# Altium footprint library altera-stratix-iv.PCBLIB: 5 footprints (part 1 of 4)
Each footprint in its own frame and in the unit in brackets; x right, y up, seen from the top. Pads: shape width x height; smd on the part's side, far side on the other; paste and mask are expansions set on the pad; w line width, h text height; cw(c..) or ccw(c..) is an arc to the next point about the centre after c.
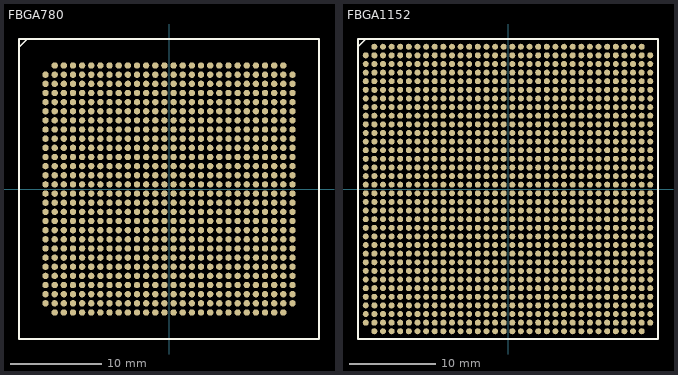
[diagram p0: the footprints below, top view; thin cyan lines are the x and y axes]

## FBGA780 [mil]
pads (780):
  rrect100% 27.56x27.56 smd: A2(-492.13,531.5) A3(-452.76,531.5) A4(-413.39,531.5) A5(-374.02,531.5) A6(-334.65,531.5) A7(-295.28,531.5) A8(-255.91,531.5) A9(-216.54,531.5) A10(-177.17,531.5) A11(-137.8,531.5) A12(-98.43,531.5) A13(-59.06,531.5) A14(-19.69,531.5) A15(19.69,531.5) A16(59.06,531.5) A17(98.43,531.5) A18(137.8,531.5) A19(177.17,531.5) A20(216.54,531.5) A21(255.91,531.5) A22(295.28,531.5) A23(334.65,531.5) A24(374.02,531.5) A25(413.39,531.5) A26(452.76,531.5) A27(492.13,531.5) AA1(-531.5,-255.91) AA2(-492.13,-255.91) AA3(-452.76,-255.91) AA4(-413.39,-255.91) AA5(-374.02,-255.91) AA6(-334.65,-255.91) AA7(-295.28,-255.91) AA8(-255.91,-255.91) AA9(-216.54,-255.91) AA10(-177.17,-255.91) AA11(-137.8,-255.91) AA12(-98.43,-255.91) AA13(-59.06,-255.91) AA14(-19.69,-255.91) AA15(19.69,-255.91) AA16(59.06,-255.91) AA17(98.43,-255.91) AA18(137.8,-255.91) AA19(177.17,-255.91) AA20(216.54,-255.91) AA21(255.91,-255.91) AA22(295.28,-255.91) AA23(334.65,-255.91) AA24(374.02,-255.91) AA25(413.39,-255.91) AA26(452.76,-255.91) AA27(492.13,-255.91) AA28(531.5,-255.91) AB1(-531.5,-295.28) AB2(-492.13,-295.28) AB3(-452.76,-295.28) AB4(-413.39,-295.28) AB5(-374.02,-295.28) AB6(-334.65,-295.28) AB7(-295.28,-295.28) AB8(-255.91,-295.28) AB9(-216.54,-295.28) AB10(-177.17,-295.28) AB11(-137.8,-295.28) AB12(-98.43,-295.28) AB13(-59.06,-295.28) AB14(-19.69,-295.28) AB15(19.69,-295.28) AB16(59.06,-295.28) AB17(98.43,-295.28) AB18(137.8,-295.28) AB19(177.17,-295.28) AB20(216.54,-295.28) AB21(255.91,-295.28) AB22(295.28,-295.28) AB23(334.65,-295.28) AB24(374.02,-295.28) AB25(413.39,-295.28) AB26(452.76,-295.28) AB27(492.13,-295.28) AB28(531.5,-295.28) AC1(-531.5,-334.65) AC2(-492.13,-334.65) AC3(-452.76,-334.65) AC4(-413.39,-334.65) AC5(-374.02,-334.65) AC6(-334.65,-334.65) AC7(-295.28,-334.65) AC8(-255.91,-334.65) AC9(-216.54,-334.65) AC10(-177.17,-334.65) AC11(-137.8,-334.65) AC12(-98.43,-334.65) AC13(-59.06,-334.65) AC14(-19.69,-334.65) AC15(19.69,-334.65) AC16(59.06,-334.65) AC17(98.43,-334.65) AC18(137.8,-334.65) AC19(177.17,-334.65) AC20(216.54,-334.65) AC21(255.91,-334.65) AC22(295.28,-334.65) AC23(334.65,-334.65) AC24(374.02,-334.65) AC25(413.39,-334.65) AC26(452.76,-334.65) AC27(492.13,-334.65) AC28(531.5,-334.65) AD1(-531.5,-374.02) AD2(-492.13,-374.02) AD3(-452.76,-374.02) AD4(-413.39,-374.02) AD5(-374.02,-374.02) AD6(-334.65,-374.02) AD7(-295.28,-374.02) AD8(-255.91,-374.02) AD9(-216.54,-374.02) AD10(-177.17,-374.02) AD11(-137.8,-374.02) AD12(-98.43,-374.02) AD13(-59.06,-374.02) AD14(-19.69,-374.02) AD15(19.69,-374.02) AD16(59.06,-374.02) AD17(98.43,-374.02) AD18(137.8,-374.02) AD19(177.17,-374.02) AD20(216.54,-374.02) AD21(255.91,-374.02) AD22(295.28,-374.02) AD23(334.65,-374.02) AD24(374.02,-374.02) AD25(413.39,-374.02) AD26(452.76,-374.02) AD27(492.13,-374.02) AD28(531.5,-374.02) AE1(-531.5,-413.39) AE2(-492.13,-413.39) AE3(-452.76,-413.39) AE4(-413.39,-413.39) AE5(-374.02,-413.39) AE6(-334.65,-413.39) AE7(-295.28,-413.39) AE8(-255.91,-413.39) AE9(-216.54,-413.39) AE10(-177.17,-413.39) AE11(-137.8,-413.39) AE12(-98.43,-413.39) AE13(-59.06,-413.39) AE14(-19.69,-413.39) AE15(19.69,-413.39) AE16(59.06,-413.39) AE17(98.43,-413.39) AE18(137.8,-413.39) AE19(177.17,-413.39) AE20(216.54,-413.39) AE21(255.91,-413.39) AE22(295.28,-413.39) AE23(334.65,-413.39) AE24(374.02,-413.39) AE25(413.39,-413.39) AE26(452.76,-413.39) AE27(492.13,-413.39) AE28(531.5,-413.39) AF1(-531.5,-452.76) AF2(-492.13,-452.76) AF3(-452.76,-452.76) AF4(-413.39,-452.76) AF5(-374.02,-452.76) AF6(-334.65,-452.76) AF7(-295.28,-452.76) AF8(-255.91,-452.76) AF9(-216.54,-452.76) AF10(-177.17,-452.76) AF11(-137.8,-452.76) AF12(-98.43,-452.76) AF13(-59.06,-452.76) AF14(-19.69,-452.76) AF15(19.69,-452.76) AF16(59.06,-452.76) AF17(98.43,-452.76) AF18(137.8,-452.76) AF19(177.17,-452.76) AF20(216.54,-452.76) AF21(255.91,-452.76) AF22(295.28,-452.76) AF23(334.65,-452.76) AF24(374.02,-452.76) AF25(413.39,-452.76) AF26(452.76,-452.76) AF27(492.13,-452.76) AF28(531.5,-452.76) AG1(-531.5,-492.13) AG2(-492.13,-492.13) AG3(-452.76,-492.13) AG4(-413.39,-492.13) AG5(-374.02,-492.13) AG6(-334.65,-492.13) AG7(-295.28,-492.13) AG8(-255.91,-492.13) AG9(-216.54,-492.13) AG10(-177.17,-492.13) AG11(-137.8,-492.13) AG12(-98.43,-492.13) AG13(-59.06,-492.13) AG14(-19.69,-492.13) AG15(19.69,-492.13) AG16(59.06,-492.13) AG17(98.43,-492.13) AG18(137.8,-492.13) AG19(177.17,-492.13) AG20(216.54,-492.13) AG21(255.91,-492.13) AG22(295.28,-492.13) AG23(334.65,-492.13) AG24(374.02,-492.13) AG25(413.39,-492.13) AG26(452.76,-492.13) AG27(492.13,-492.13) AG28(531.5,-492.13) AH2(-492.13,-531.5) AH3(-452.76,-531.5) AH4(-413.39,-531.5) AH5(-374.02,-531.5) AH6(-334.65,-531.5) AH7(-295.28,-531.5) AH8(-255.91,-531.5) AH9(-216.54,-531.5) AH10(-177.17,-531.5) AH11(-137.8,-531.5) AH12(-98.43,-531.5) AH13(-59.06,-531.5) AH14(-19.69,-531.5) AH15(19.69,-531.5) AH16(59.06,-531.5) AH17(98.43,-531.5) AH18(137.8,-531.5) AH19(177.17,-531.5) AH20(216.54,-531.5) AH21(255.91,-531.5) AH22(295.28,-531.5) AH23(334.65,-531.5) AH24(374.02,-531.5) AH25(413.39,-531.5) AH26(452.76,-531.5) AH27(492.13,-531.5) B1(-531.5,492.13) B2(-492.13,492.13) B3(-452.76,492.13) B4(-413.39,492.13) B5(-374.02,492.13) B6(-334.65,492.13) B7(-295.28,492.13) B8(-255.91,492.13) B9(-216.54,492.13) B10(-177.17,492.13) B11(-137.8,492.13) B12(-98.43,492.13) B13(-59.06,492.13) B14(-19.69,492.13) B15(19.69,492.13) B16(59.06,492.13) B17(98.43,492.13) B18(137.8,492.13) B19(177.17,492.13) B20(216.54,492.13) B21(255.91,492.13) B22(295.28,492.13) B23(334.65,492.13) B24(374.02,492.13) B25(413.39,492.13) B26(452.76,492.13) B27(492.13,492.13) B28(531.5,492.13) C1(-531.5,452.76) C2(-492.13,452.76) C3(-452.76,452.76) C4(-413.39,452.76) C5(-374.02,452.76) C6(-334.65,452.76) C7(-295.28,452.76) C8(-255.91,452.76) C9(-216.54,452.76) C10(-177.17,452.76) C11(-137.8,452.76) C12(-98.43,452.76) C13(-59.06,452.76) C14(-19.69,452.76) C15(19.69,452.76) C16(59.06,452.76) C17(98.43,452.76) C18(137.8,452.76) C19(177.17,452.76) C20(216.54,452.76) C21(255.91,452.76) C22(295.28,452.76) C23(334.65,452.76) C24(374.02,452.76) C25(413.39,452.76) C26(452.76,452.76) C27(492.13,452.76) C28(531.5,452.76) D1(-531.5,413.39) D2(-492.13,413.39) D3(-452.76,413.39) D4(-413.39,413.39) D5(-374.02,413.39) D6(-334.65,413.39) D7(-295.28,413.39) D8(-255.91,413.39) D9(-216.54,413.39) D10(-177.17,413.39) D11(-137.8,413.39) D12(-98.43,413.39) D13(-59.06,413.39) D14(-19.69,413.39) D15(19.69,413.39) D16(59.06,413.39) D17(98.43,413.39) D18(137.8,413.39) D19(177.17,413.39) D20(216.54,413.39) D21(255.91,413.39) D22(295.28,413.39) D23(334.65,413.39) D24(374.02,413.39) D25(413.39,413.39) D26(452.76,413.39) D27(492.13,413.39) D28(531.5,413.39) E1(-531.5,374.02) E2(-492.13,374.02) E3(-452.76,374.02) E4(-413.39,374.02) E5(-374.02,374.02) E6(-334.65,374.02) E7(-295.28,374.02) E8(-255.91,374.02) E9(-216.54,374.02) E10(-177.17,374.02) E11(-137.8,374.02) E12(-98.43,374.02) E13(-59.06,374.02) E14(-19.69,374.02) E15(19.69,374.02) E16(59.06,374.02) E17(98.43,374.02) E18(137.8,374.02) E19(177.17,374.02) E20(216.54,374.02) E21(255.91,374.02) E22(295.28,374.02) E23(334.65,374.02) E24(374.02,374.02) E25(413.39,374.02) E26(452.76,374.02) E27(492.13,374.02) E28(531.5,374.02) F1(-531.5,334.65) F2(-492.13,334.65) F3(-452.76,334.65) F4(-413.39,334.65) F5(-374.02,334.65) F6(-334.65,334.65) F7(-295.28,334.65) F8(-255.91,334.65) F9(-216.54,334.65) F10(-177.17,334.65) F11(-137.8,334.65) F12(-98.43,334.65) F13(-59.06,334.65) F14(-19.69,334.65) F15(19.69,334.65) F16(59.06,334.65) F17(98.43,334.65) F18(137.8,334.65) F19(177.17,334.65) F20(216.54,334.65) F21(255.91,334.65) F22(295.28,334.65) F23(334.65,334.65) F24(374.02,334.65) F25(413.39,334.65) F26(452.76,334.65) F27(492.13,334.65) F28(531.5,334.65) G1(-531.5,295.28) G2(-492.13,295.28) G3(-452.76,295.28) G4(-413.39,295.28) G5(-374.02,295.28) G6(-334.65,295.28) G7(-295.28,295.28) G8(-255.91,295.28) G9(-216.54,295.28) G10(-177.17,295.28) G11(-137.8,295.28) G12(-98.43,295.28) G13(-59.06,295.28) G14(-19.69,295.28) G15(19.69,295.28) G16(59.06,295.28) G17(98.43,295.28) G18(137.8,295.28) G19(177.17,295.28) G20(216.54,295.28) G21(255.91,295.28) G22(295.28,295.28) G23(334.65,295.28) G24(374.02,295.28) G25(413.39,295.28) G26(452.76,295.28) G27(492.13,295.28) G28(531.5,295.28) H1(-531.5,255.91) H2(-492.13,255.91) H3(-452.76,255.91) H4(-413.39,255.91) H5(-374.02,255.91) H6(-334.65,255.91) H7(-295.28,255.91) H8(-255.91,255.91) H9(-216.54,255.91) H10(-177.17,255.91) H11(-137.8,255.91) H12(-98.43,255.91) H13(-59.06,255.91) H14(-19.69,255.91) H15(19.69,255.91) H16(59.06,255.91) H17(98.43,255.91) H18(137.8,255.91) H19(177.17,255.91) H20(216.54,255.91) H21(255.91,255.91) H22(295.28,255.91) H23(334.65,255.91) H24(374.02,255.91) H25(413.39,255.91) H26(452.76,255.91) H27(492.13,255.91) H28(531.5,255.91) J1(-531.5,216.54) J2(-492.13,216.54) J3(-452.76,216.54) J4(-413.39,216.54) J5(-374.02,216.54) J6(-334.65,216.54) J7(-295.28,216.54) J8(-255.91,216.54) J9(-216.54,216.54) J10(-177.17,216.54) J11(-137.8,216.54) J12(-98.43,216.54) J13(-59.06,216.54) J14(-19.69,216.54) J15(19.69,216.54) J16(59.06,216.54) J17(98.43,216.54) J18(137.8,216.54) J19(177.17,216.54) J20(216.54,216.54) J21(255.91,216.54) J22(295.28,216.54) J23(334.65,216.54) J24(374.02,216.54) J25(413.39,216.54) J26(452.76,216.54) J27(492.13,216.54) J28(531.5,216.54) K1(-531.5,177.17) K2(-492.13,177.17) K3(-452.76,177.17) K4(-413.39,177.17) K5(-374.02,177.17) K6(-334.65,177.17) K7(-295.28,177.17) K8(-255.91,177.17) K9(-216.54,177.17) K10(-177.17,177.17) K11(-137.8,177.17) K12(-98.43,177.17) K13(-59.06,177.17) K14(-19.69,177.17) K15(19.69,177.17) K16(59.06,177.17) K17(98.43,177.17) K18(137.8,177.17) K19(177.17,177.17) K20(216.54,177.17) K21(255.91,177.17) K22(295.28,177.17) K23(334.65,177.17) K24(374.02,177.17) K25(413.39,177.17) K26(452.76,177.17) K27(492.13,177.17) K28(531.5,177.17) L1(-531.5,137.8) L2(-492.13,137.8) L3(-452.76,137.8) L4(-413.39,137.8) L5(-374.02,137.8) L6(-334.65,137.8) L7(-295.28,137.8) L8(-255.91,137.8) L9(-216.54,137.8) L10(-177.17,137.8) L11(-137.8,137.8) L12(-98.43,137.8) L13(-59.06,137.8) L14(-19.69,137.8) L15(19.69,137.8) L16(59.06,137.8) L17(98.43,137.8) L18(137.8,137.8) L19(177.17,137.8) L20(216.54,137.8) L21(255.91,137.8) L22(295.28,137.8) L23(334.65,137.8) L24(374.02,137.8) L25(413.39,137.8) L26(452.76,137.8) L27(492.13,137.8) L28(531.5,137.8) M1(-531.5,98.43) M2(-492.13,98.43) M3(-452.76,98.43) M4(-413.39,98.43) M5(-374.02,98.43) M6(-334.65,98.43) M7(-295.28,98.43) M8(-255.91,98.43) M9(-216.54,98.43) M10(-177.17,98.43) M11(-137.8,98.43) M12(-98.43,98.43) M13(-59.06,98.43) M14(-19.69,98.43) M15(19.69,98.43) M16(59.06,98.43) M17(98.43,98.43) M18(137.8,98.43) M19(177.17,98.43) M20(216.54,98.43) M21(255.91,98.43) M22(295.28,98.43) M23(334.65,98.43) M24(374.02,98.43) M25(413.39,98.43) M26(452.76,98.43) M27(492.13,98.43) M28(531.5,98.43) N1(-531.5,59.06) N2(-492.13,59.06) N3(-452.76,59.06) N4(-413.39,59.06) N5(-374.02,59.06) N6(-334.65,59.06) N7(-295.28,59.06) N8(-255.91,59.06) N9(-216.54,59.06) N10(-177.17,59.06) N11(-137.8,59.06) N12(-98.43,59.06) N13(-59.06,59.06) N14(-19.69,59.06) N15(19.69,59.06) N16(59.06,59.06) N17(98.43,59.06) N18(137.8,59.06) N19(177.17,59.06) N20(216.54,59.06) N21(255.91,59.06) N22(295.28,59.06) N23(334.65,59.06) N24(374.02,59.06) N25(413.39,59.06) N26(452.76,59.06) N27(492.13,59.06) N28(531.5,59.06) P1(-531.5,19.69) P2(-492.13,19.69) P3(-452.76,19.69) P4(-413.39,19.69) P5(-374.02,19.69) P6(-334.65,19.69) P7(-295.28,19.69) P8(-255.91,19.69) P9(-216.54,19.69) P10(-177.17,19.69) P11(-137.8,19.69) P12(-98.43,19.69) P13(-59.06,19.69) P14(-19.69,19.69) P15(19.69,19.69) P16(59.06,19.69) P17(98.43,19.69) P18(137.8,19.69) P19(177.17,19.69) P20(216.54,19.69) P21(255.91,19.69) P22(295.28,19.69) P23(334.65,19.69) P24(374.02,19.69) P25(413.39,19.69) P26(452.76,19.69) P27(492.13,19.69) P28(531.5,19.69) R1(-531.5,-19.69) R2(-492.13,-19.69) R3(-452.76,-19.69) R4(-413.39,-19.69) R5(-374.02,-19.69) R6(-334.65,-19.69) R7(-295.28,-19.69) R8(-255.91,-19.69) R9(-216.54,-19.69) R10(-177.17,-19.69) R11(-137.8,-19.69) R12(-98.43,-19.69) R13(-59.06,-19.69) R14(-19.69,-19.69) R15(19.69,-19.69) R16(59.06,-19.69) R17(98.43,-19.69) R18(137.8,-19.69) R19(177.17,-19.69) R20(216.54,-19.69) R21(255.91,-19.69) R22(295.28,-19.69) R23(334.65,-19.69) R24(374.02,-19.69) R25(413.39,-19.69) R26(452.76,-19.69) R27(492.13,-19.69) R28(531.5,-19.69) T1(-531.5,-59.06) T2(-492.13,-59.06) T3(-452.76,-59.06) T4(-413.39,-59.06) T5(-374.02,-59.06) T6(-334.65,-59.06) T7(-295.28,-59.06) T8(-255.91,-59.06) T9(-216.54,-59.06) T10(-177.17,-59.06) T11(-137.8,-59.06) T12(-98.43,-59.06) T13(-59.06,-59.06) T14(-19.69,-59.06) T15(19.69,-59.06) T16(59.06,-59.06) T17(98.43,-59.06) T18(137.8,-59.06) T19(177.17,-59.06) T20(216.54,-59.06) T21(255.91,-59.06) T22(295.28,-59.06) T23(334.65,-59.06) T24(374.02,-59.06) T25(413.39,-59.06) T26(452.76,-59.06) T27(492.13,-59.06) T28(531.5,-59.06) U1(-531.5,-98.43) U2(-492.13,-98.43) U3(-452.76,-98.43) U4(-413.39,-98.43) U5(-374.02,-98.43) U6(-334.65,-98.43) U7(-295.28,-98.43) U8(-255.91,-98.43) U9(-216.54,-98.43) U10(-177.17,-98.43) U11(-137.8,-98.43) U12(-98.43,-98.43) U13(-59.06,-98.43) U14(-19.69,-98.43) U15(19.69,-98.43) U16(59.06,-98.43) U17(98.43,-98.43) U18(137.8,-98.43) U19(177.17,-98.43) U20(216.54,-98.43) U21(255.91,-98.43) U22(295.28,-98.43) U23(334.65,-98.43) U24(374.02,-98.43) U25(413.39,-98.43) U26(452.76,-98.43) U27(492.13,-98.43) U28(531.5,-98.43) V1(-531.5,-137.8) V2(-492.13,-137.8) V3(-452.76,-137.8) V4(-413.39,-137.8) V5(-374.02,-137.8) V6(-334.65,-137.8) V7(-295.28,-137.8) V8(-255.91,-137.8) V9(-216.54,-137.8) V10(-177.17,-137.8) V11(-137.8,-137.8) V12(-98.43,-137.8) V13(-59.06,-137.8) V14(-19.69,-137.8) V15(19.69,-137.8) V16(59.06,-137.8) V17(98.43,-137.8) V18(137.8,-137.8) V19(177.17,-137.8) V20(216.54,-137.8) V21(255.91,-137.8) V22(295.28,-137.8) V23(334.65,-137.8) V24(374.02,-137.8) V25(413.39,-137.8) V26(452.76,-137.8) V27(492.13,-137.8) V28(531.5,-137.8) W1(-531.5,-177.17) W2(-492.13,-177.17) W3(-452.76,-177.17) W4(-413.39,-177.17) W5(-374.02,-177.17) W6(-334.65,-177.17) W7(-295.28,-177.17) W8(-255.91,-177.17) W9(-216.54,-177.17) W10(-177.17,-177.17) W11(-137.8,-177.17) W12(-98.43,-177.17) W13(-59.06,-177.17) W14(-19.69,-177.17) W15(19.69,-177.17) W16(59.06,-177.17) W17(98.43,-177.17) W18(137.8,-177.17) W19(177.17,-177.17) W20(216.54,-177.17) W21(255.91,-177.17) W22(295.28,-177.17) W23(334.65,-177.17) W24(374.02,-177.17) W25(413.39,-177.17) W26(452.76,-177.17) W27(492.13,-177.17) W28(531.5,-177.17) Y1(-531.5,-216.54) Y2(-492.13,-216.54) Y3(-452.76,-216.54) Y4(-413.39,-216.54) Y5(-374.02,-216.54) Y6(-334.65,-216.54) Y7(-295.28,-216.54) Y8(-255.91,-216.54) Y9(-216.54,-216.54) Y10(-177.17,-216.54) Y11(-137.8,-216.54) Y12(-98.43,-216.54) Y13(-59.06,-216.54) Y14(-19.69,-216.54) Y15(19.69,-216.54) Y16(59.06,-216.54) Y17(98.43,-216.54) Y18(137.8,-216.54) Y19(177.17,-216.54) Y20(216.54,-216.54) Y21(255.91,-216.54) Y22(295.28,-216.54) Y23(334.65,-216.54) Y24(374.02,-216.54) Y25(413.39,-216.54) Y26(452.76,-216.54) Y27(492.13,-216.54) Y28(531.5,-216.54)
Top Overlay:
  lines w8: -645.61,610.24 -645.61,645.61 -610.24,645.61 ; -645.61,610.24 -645.61,-645.61 645.61,-645.61 645.61,645.61 -610.24,645.61 ; -645.61,610.24 -610.24,645.61
Top Solder:
  drawing of 780 lines, arcs and shapes, not listed

## FBGA1152 [mil]
pads (1152):
  rrect100% 27.56x27.56 smd: A2(-610.24,649.61) A3(-570.87,649.61) A4(-531.5,649.61) A5(-492.13,649.61) A6(-452.76,649.61) A7(-413.39,649.61) A8(-374.02,649.61) A9(-334.65,649.61) A10(-295.28,649.61) A11(-255.91,649.61) A12(-216.54,649.61) A13(-177.17,649.61) A14(-137.8,649.61) A15(-98.43,649.61) A16(-59.06,649.61) A17(-19.69,649.61) A18(19.69,649.61) A19(59.06,649.61) A20(98.43,649.61) A21(137.8,649.61) A22(177.17,649.61) A23(216.54,649.61) A24(255.91,649.61) A25(295.28,649.61) A26(334.65,649.61) A27(374.02,649.61) A28(413.39,649.61) A29(452.76,649.61) A30(492.13,649.61) A31(531.5,649.61) A32(570.87,649.61) A33(610.24,649.61) AA1(-649.61,-137.8) AA2(-610.24,-137.8) AA3(-570.87,-137.8) AA4(-531.5,-137.8) AA5(-492.13,-137.8) AA6(-452.76,-137.8) AA7(-413.39,-137.8) AA8(-374.02,-137.8) AA9(-334.65,-137.8) AA10(-295.28,-137.8) AA11(-255.91,-137.8) AA12(-216.54,-137.8) AA13(-177.17,-137.8) AA14(-137.8,-137.8) AA15(-98.43,-137.8) AA16(-59.06,-137.8) AA17(-19.69,-137.8) AA18(19.69,-137.8) AA19(59.06,-137.8) AA20(98.43,-137.8) AA21(137.8,-137.8) AA22(177.17,-137.8) AA23(216.54,-137.8) AA24(255.91,-137.8) AA25(295.28,-137.8) AA26(334.65,-137.8) AA27(374.02,-137.8) AA28(413.39,-137.8) AA29(452.76,-137.8) AA30(492.13,-137.8) AA31(531.5,-137.8) AA32(570.87,-137.8) AA33(610.24,-137.8) AA34(649.61,-137.8) AB1(-649.61,-177.17) AB2(-610.24,-177.17) AB3(-570.87,-177.17) AB4(-531.5,-177.17) AB5(-492.13,-177.17) AB6(-452.76,-177.17) AB7(-413.39,-177.17) AB8(-374.02,-177.17) AB9(-334.65,-177.17) AB10(-295.28,-177.17) AB11(-255.91,-177.17) AB12(-216.54,-177.17) AB13(-177.17,-177.17) AB14(-137.8,-177.17) AB15(-98.43,-177.17) AB16(-59.06,-177.17) AB17(-19.69,-177.17) AB18(19.69,-177.17) AB19(59.06,-177.17) AB20(98.43,-177.17) AB21(137.8,-177.17) AB22(177.17,-177.17) AB23(216.54,-177.17) AB24(255.91,-177.17) AB25(295.28,-177.17) AB26(334.65,-177.17) AB27(374.02,-177.17) AB28(413.39,-177.17) AB29(452.76,-177.17) AB30(492.13,-177.17) AB31(531.5,-177.17) AB32(570.87,-177.17) AB33(610.24,-177.17) AB34(649.61,-177.17) AC1(-649.61,-216.54) AC2(-610.24,-216.54) AC3(-570.87,-216.54) AC4(-531.5,-216.54) AC5(-492.13,-216.54) AC6(-452.76,-216.54) AC7(-413.39,-216.54) AC8(-374.02,-216.54) AC9(-334.65,-216.54) AC10(-295.28,-216.54) AC11(-255.91,-216.54) AC12(-216.54,-216.54) AC13(-177.17,-216.54) AC14(-137.8,-216.54) AC15(-98.43,-216.54) AC16(-59.06,-216.54) AC17(-19.69,-216.54) AC18(19.69,-216.54) AC19(59.06,-216.54) AC20(98.43,-216.54) AC21(137.8,-216.54) AC22(177.17,-216.54) AC23(216.54,-216.54) AC24(255.91,-216.54) AC25(295.28,-216.54) AC26(334.65,-216.54) AC27(374.02,-216.54) AC28(413.39,-216.54) AC29(452.76,-216.54) AC30(492.13,-216.54) AC31(531.5,-216.54) AC32(570.87,-216.54) AC33(610.24,-216.54) AC34(649.61,-216.54) AD1(-649.61,-255.91) AD2(-610.24,-255.91) AD3(-570.87,-255.91) AD4(-531.5,-255.91) AD5(-492.13,-255.91) AD6(-452.76,-255.91) AD7(-413.39,-255.91) AD8(-374.02,-255.91) AD9(-334.65,-255.91) AD10(-295.28,-255.91) AD11(-255.91,-255.91) AD12(-216.54,-255.91) AD13(-177.17,-255.91) AD14(-137.8,-255.91) AD15(-98.43,-255.91) AD16(-59.06,-255.91) AD17(-19.69,-255.91) AD18(19.69,-255.91) AD19(59.06,-255.91) AD20(98.43,-255.91) AD21(137.8,-255.91) AD22(177.17,-255.91) AD23(216.54,-255.91) AD24(255.91,-255.91) AD25(295.28,-255.91) AD26(334.65,-255.91) AD27(374.02,-255.91) AD28(413.39,-255.91) AD29(452.76,-255.91) AD30(492.13,-255.91) AD31(531.5,-255.91) AD32(570.87,-255.91) AD33(610.24,-255.91) AD34(649.61,-255.91) AE1(-649.61,-295.28) AE2(-610.24,-295.28) AE3(-570.87,-295.28) AE4(-531.5,-295.28) AE5(-492.13,-295.28) AE6(-452.76,-295.28) AE7(-413.39,-295.28) AE8(-374.02,-295.28) AE9(-334.65,-295.28) AE10(-295.28,-295.28) AE11(-255.91,-295.28) AE12(-216.54,-295.28) AE13(-177.17,-295.28) AE14(-137.8,-295.28) AE15(-98.43,-295.28) AE16(-59.06,-295.28) AE17(-19.69,-295.28) AE18(19.69,-295.28) AE19(59.06,-295.28) AE20(98.43,-295.28) AE21(137.8,-295.28) AE22(177.17,-295.28) AE23(216.54,-295.28) AE24(255.91,-295.28) AE25(295.28,-295.28) AE26(334.65,-295.28) AE27(374.02,-295.28) AE28(413.39,-295.28) AE29(452.76,-295.28) AE30(492.13,-295.28) AE31(531.5,-295.28) AE32(570.87,-295.28) AE33(610.24,-295.28) AE34(649.61,-295.28) AF1(-649.61,-334.65) AF2(-610.24,-334.65) AF3(-570.87,-334.65) AF4(-531.5,-334.65) AF5(-492.13,-334.65) AF6(-452.76,-334.65) AF7(-413.39,-334.65) AF8(-374.02,-334.65) AF9(-334.65,-334.65) AF10(-295.28,-334.65) AF11(-255.91,-334.65) AF12(-216.54,-334.65) AF13(-177.17,-334.65) AF14(-137.8,-334.65) AF15(-98.43,-334.65) AF16(-59.06,-334.65) AF17(-19.69,-334.65) AF18(19.69,-334.65) AF19(59.06,-334.65) AF20(98.43,-334.65) AF21(137.8,-334.65) AF22(177.17,-334.65) AF23(216.54,-334.65) AF24(255.91,-334.65) AF25(295.28,-334.65) AF26(334.65,-334.65) AF27(374.02,-334.65) AF28(413.39,-334.65) AF29(452.76,-334.65) AF30(492.13,-334.65) AF31(531.5,-334.65) AF32(570.87,-334.65) AF33(610.24,-334.65) AF34(649.61,-334.65) AG1(-649.61,-374.02) AG2(-610.24,-374.02) AG3(-570.87,-374.02) AG4(-531.5,-374.02) AG5(-492.13,-374.02) AG6(-452.76,-374.02) AG7(-413.39,-374.02) AG8(-374.02,-374.02) AG9(-334.65,-374.02) AG10(-295.28,-374.02) AG11(-255.91,-374.02) AG12(-216.54,-374.02) AG13(-177.17,-374.02) AG14(-137.8,-374.02) AG15(-98.43,-374.02) AG16(-59.06,-374.02) AG17(-19.69,-374.02) AG18(19.69,-374.02) AG19(59.06,-374.02) AG20(98.43,-374.02) AG21(137.8,-374.02) AG22(177.17,-374.02) AG23(216.54,-374.02) AG24(255.91,-374.02) AG25(295.28,-374.02) AG26(334.65,-374.02) AG27(374.02,-374.02) AG28(413.39,-374.02) AG29(452.76,-374.02) AG30(492.13,-374.02) AG31(531.5,-374.02) AG32(570.87,-374.02) AG33(610.24,-374.02) AG34(649.61,-374.02) AH1(-649.61,-413.39) AH2(-610.24,-413.39) AH3(-570.87,-413.39) AH4(-531.5,-413.39) AH5(-492.13,-413.39) AH6(-452.76,-413.39) AH7(-413.39,-413.39) AH8(-374.02,-413.39) AH9(-334.65,-413.39) AH10(-295.28,-413.39) AH11(-255.91,-413.39) AH12(-216.54,-413.39) AH13(-177.17,-413.39) AH14(-137.8,-413.39) AH15(-98.43,-413.39) AH16(-59.06,-413.39) AH17(-19.69,-413.39) AH18(19.69,-413.39) AH19(59.06,-413.39) AH20(98.43,-413.39) AH21(137.8,-413.39) AH22(177.17,-413.39) AH23(216.54,-413.39) AH24(255.91,-413.39) AH25(295.28,-413.39) AH26(334.65,-413.39) AH27(374.02,-413.39) AH28(413.39,-413.39) AH29(452.76,-413.39) AH30(492.13,-413.39) AH31(531.5,-413.39) AH32(570.87,-413.39) AH33(610.24,-413.39) AH34(649.61,-413.39) AJ1(-649.61,-452.76) AJ2(-610.24,-452.76) AJ3(-570.87,-452.76) AJ4(-531.5,-452.76) AJ5(-492.13,-452.76) AJ6(-452.76,-452.76) AJ7(-413.39,-452.76) AJ8(-374.02,-452.76) AJ9(-334.65,-452.76) AJ10(-295.28,-452.76) AJ11(-255.91,-452.76) AJ12(-216.54,-452.76) AJ13(-177.17,-452.76) AJ14(-137.8,-452.76) AJ15(-98.43,-452.76) AJ16(-59.06,-452.76) AJ17(-19.69,-452.76) AJ18(19.69,-452.76) AJ19(59.06,-452.76) AJ20(98.43,-452.76) AJ21(137.8,-452.76) AJ22(177.17,-452.76) AJ23(216.54,-452.76) AJ24(255.91,-452.76) AJ25(295.28,-452.76) AJ26(334.65,-452.76) AJ27(374.02,-452.76) AJ28(413.39,-452.76) AJ29(452.76,-452.76) AJ30(492.13,-452.76) AJ31(531.5,-452.76) AJ32(570.87,-452.76) AJ33(610.24,-452.76) AJ34(649.61,-452.76) AK1(-649.61,-492.13) AK2(-610.24,-492.13) AK3(-570.87,-492.13) AK4(-531.5,-492.13) AK5(-492.13,-492.13) AK6(-452.76,-492.13) AK7(-413.39,-492.13) AK8(-374.02,-492.13) AK9(-334.65,-492.13) AK10(-295.28,-492.13) AK11(-255.91,-492.13) AK12(-216.54,-492.13) AK13(-177.17,-492.13) AK14(-137.8,-492.13) AK15(-98.43,-492.13) AK16(-59.06,-492.13) AK17(-19.69,-492.13) AK18(19.69,-492.13) AK19(59.06,-492.13) AK20(98.43,-492.13) AK21(137.8,-492.13) AK22(177.17,-492.13) AK23(216.54,-492.13) AK24(255.91,-492.13) AK25(295.28,-492.13) AK26(334.65,-492.13) AK27(374.02,-492.13) AK28(413.39,-492.13) AK29(452.76,-492.13) AK30(492.13,-492.13) AK31(531.5,-492.13) AK32(570.87,-492.13) AK33(610.24,-492.13) AK34(649.61,-492.13) AL1(-649.61,-531.5) AL2(-610.24,-531.5) AL3(-570.87,-531.5) AL4(-531.5,-531.5) AL5(-492.13,-531.5) AL6(-452.76,-531.5) AL7(-413.39,-531.5) AL8(-374.02,-531.5) AL9(-334.65,-531.5) AL10(-295.28,-531.5) AL11(-255.91,-531.5) AL12(-216.54,-531.5) AL13(-177.17,-531.5) AL14(-137.8,-531.5) AL15(-98.43,-531.5) AL16(-59.06,-531.5) AL17(-19.69,-531.5) AL18(19.69,-531.5) AL19(59.06,-531.5) AL20(98.43,-531.5) AL21(137.8,-531.5) AL22(177.17,-531.5) AL23(216.54,-531.5) AL24(255.91,-531.5) AL25(295.28,-531.5) AL26(334.65,-531.5) AL27(374.02,-531.5) AL28(413.39,-531.5) AL29(452.76,-531.5) AL30(492.13,-531.5) AL31(531.5,-531.5) AL32(570.87,-531.5) AL33(610.24,-531.5) AL34(649.61,-531.5) AM1(-649.61,-570.87) AM2(-610.24,-570.87) AM3(-570.87,-570.87) AM4(-531.5,-570.87) AM5(-492.13,-570.87) AM6(-452.76,-570.87) AM7(-413.39,-570.87) AM8(-374.02,-570.87) AM9(-334.65,-570.87) AM10(-295.28,-570.87) AM11(-255.91,-570.87) AM12(-216.54,-570.87) AM13(-177.17,-570.87) AM14(-137.8,-570.87) AM15(-98.43,-570.87) AM16(-59.06,-570.87) AM17(-19.69,-570.87) AM18(19.69,-570.87) AM19(59.06,-570.87) AM20(98.43,-570.87) AM21(137.8,-570.87) AM22(177.17,-570.87) AM23(216.54,-570.87) AM24(255.91,-570.87) AM25(295.28,-570.87) AM26(334.65,-570.87) AM27(374.02,-570.87) AM28(413.39,-570.87) AM29(452.76,-570.87) AM30(492.13,-570.87) AM31(531.5,-570.87) AM32(570.87,-570.87) AM33(610.24,-570.87) AM34(649.61,-570.87) AN1(-649.61,-610.24) AN2(-610.24,-610.24) AN3(-570.87,-610.24) AN4(-531.5,-610.24) AN5(-492.13,-610.24) AN6(-452.76,-610.24) AN7(-413.39,-610.24) AN8(-374.02,-610.24) AN9(-334.65,-610.24) AN10(-295.28,-610.24) AN11(-255.91,-610.24) AN12(-216.54,-610.24) AN13(-177.17,-610.24) AN14(-137.8,-610.24) AN15(-98.43,-610.24) AN16(-59.06,-610.24) AN17(-19.69,-610.24) AN18(19.69,-610.24) AN19(59.06,-610.24) AN20(98.43,-610.24) AN21(137.8,-610.24) AN22(177.17,-610.24) AN23(216.54,-610.24) AN24(255.91,-610.24) AN25(295.28,-610.24) AN26(334.65,-610.24) AN27(374.02,-610.24) AN28(413.39,-610.24) AN29(452.76,-610.24) AN30(492.13,-610.24) AN31(531.5,-610.24) AN32(570.87,-610.24) AN33(610.24,-610.24) AN34(649.61,-610.24) AP2(-610.24,-649.61) AP3(-570.87,-649.61) AP4(-531.5,-649.61) AP5(-492.13,-649.61) AP6(-452.76,-649.61) AP7(-413.39,-649.61) AP8(-374.02,-649.61) AP9(-334.65,-649.61) AP10(-295.28,-649.61) AP11(-255.91,-649.61) AP12(-216.54,-649.61) AP13(-177.17,-649.61) AP14(-137.8,-649.61) AP15(-98.43,-649.61) AP16(-59.06,-649.61) AP17(-19.69,-649.61) AP18(19.69,-649.61) AP19(59.06,-649.61) AP20(98.43,-649.61) AP21(137.8,-649.61) AP22(177.17,-649.61) AP23(216.54,-649.61) AP24(255.91,-649.61) AP25(295.28,-649.61) AP26(334.65,-649.61) AP27(374.02,-649.61) AP28(413.39,-649.61) AP29(452.76,-649.61) AP30(492.13,-649.61) AP31(531.5,-649.61) AP32(570.87,-649.61) AP33(610.24,-649.61) B1(-649.61,610.24) B2(-610.24,610.24) B3(-570.87,610.24) B4(-531.5,610.24) B5(-492.13,610.24) B6(-452.76,610.24) B7(-413.39,610.24) B8(-374.02,610.24) B9(-334.65,610.24) B10(-295.28,610.24) B11(-255.91,610.24) B12(-216.54,610.24) B13(-177.17,610.24) B14(-137.8,610.24) B15(-98.43,610.24) B16(-59.06,610.24) B17(-19.69,610.24) B18(19.69,610.24) B19(59.06,610.24) B20(98.43,610.24) B21(137.8,610.24) B22(177.17,610.24) B23(216.54,610.24) B24(255.91,610.24) B25(295.28,610.24) B26(334.65,610.24) B27(374.02,610.24) B28(413.39,610.24) B29(452.76,610.24) B30(492.13,610.24) B31(531.5,610.24) B32(570.87,610.24) B33(610.24,610.24) B34(649.61,610.24) C1(-649.61,570.87) C2(-610.24,570.87) C3(-570.87,570.87) C4(-531.5,570.87) C5(-492.13,570.87) C6(-452.76,570.87) C7(-413.39,570.87) C8(-374.02,570.87) C9(-334.65,570.87) C10(-295.28,570.87) C11(-255.91,570.87) C12(-216.54,570.87) C13(-177.17,570.87) C14(-137.8,570.87) C15(-98.43,570.87) C16(-59.06,570.87) C17(-19.69,570.87) C18(19.69,570.87) C19(59.06,570.87) C20(98.43,570.87) C21(137.8,570.87) C22(177.17,570.87) C23(216.54,570.87) C24(255.91,570.87) C25(295.28,570.87) C26(334.65,570.87) C27(374.02,570.87) C28(413.39,570.87) C29(452.76,570.87) C30(492.13,570.87) C31(531.5,570.87) C32(570.87,570.87) C33(610.24,570.87) C34(649.61,570.87) D1(-649.61,531.5) D2(-610.24,531.5) D3(-570.87,531.5) D4(-531.5,531.5) D5(-492.13,531.5) D6(-452.76,531.5) D7(-413.39,531.5) D8(-374.02,531.5) D9(-334.65,531.5) D10(-295.28,531.5) D11(-255.91,531.5) D12(-216.54,531.5) D13(-177.17,531.5) D14(-137.8,531.5) D15(-98.43,531.5) D16(-59.06,531.5) D17(-19.69,531.5) D18(19.69,531.5) D19(59.06,531.5) D20(98.43,531.5) D21(137.8,531.5) D22(177.17,531.5) D23(216.54,531.5) D24(255.91,531.5) D25(295.28,531.5) D26(334.65,531.5) D27(374.02,531.5) D28(413.39,531.5) D29(452.76,531.5) D30(492.13,531.5) D31(531.5,531.5) D32(570.87,531.5) D33(610.24,531.5) D34(649.61,531.5) E1(-649.61,492.13) E2(-610.24,492.13) E3(-570.87,492.13) E4(-531.5,492.13) E5(-492.13,492.13) E6(-452.76,492.13) E7(-413.39,492.13) E8(-374.02,492.13) E9(-334.65,492.13) E10(-295.28,492.13) E11(-255.91,492.13) E12(-216.54,492.13) E13(-177.17,492.13) E14(-137.8,492.13) E15(-98.43,492.13) E16(-59.06,492.13) E17(-19.69,492.13) E18(19.69,492.13) E19(59.06,492.13) E20(98.43,492.13) E21(137.8,492.13) E22(177.17,492.13) E23(216.54,492.13) E24(255.91,492.13) E25(295.28,492.13) E26(334.65,492.13) E27(374.02,492.13) E28(413.39,492.13) E29(452.76,492.13) E30(492.13,492.13) E31(531.5,492.13) E32(570.87,492.13) E33(610.24,492.13) E34(649.61,492.13) F1(-649.61,452.76) F2(-610.24,452.76) F3(-570.87,452.76) F4(-531.5,452.76) F5(-492.13,452.76) F6(-452.76,452.76) F7(-413.39,452.76) F8(-374.02,452.76) F9(-334.65,452.76) F10(-295.28,452.76) F11(-255.91,452.76) F12(-216.54,452.76) F13(-177.17,452.76) F14(-137.8,452.76) F15(-98.43,452.76) F16(-59.06,452.76) F17(-19.69,452.76) F18(19.69,452.76) F19(59.06,452.76) F20(98.43,452.76) F21(137.8,452.76) F22(177.17,452.76) F23(216.54,452.76) F24(255.91,452.76) F25(295.28,452.76) F26(334.65,452.76) F27(374.02,452.76) F28(413.39,452.76) F29(452.76,452.76) F30(492.13,452.76) F31(531.5,452.76) F32(570.87,452.76) F33(610.24,452.76) F34(649.61,452.76) G1(-649.61,413.39) G2(-610.24,413.39) G3(-570.87,413.39) G4(-531.5,413.39) G5(-492.13,413.39) G6(-452.76,413.39) G7(-413.39,413.39) G8(-374.02,413.39) G9(-334.65,413.39) G10(-295.28,413.39) G11(-255.91,413.39) G12(-216.54,413.39) G13(-177.17,413.39) G14(-137.8,413.39) G15(-98.43,413.39) G16(-59.06,413.39) G17(-19.69,413.39) G18(19.69,413.39) G19(59.06,413.39) G20(98.43,413.39) G21(137.8,413.39) G22(177.17,413.39) G23(216.54,413.39) G24(255.91,413.39) G25(295.28,413.39) G26(334.65,413.39) G27(374.02,413.39) G28(413.39,413.39) G29(452.76,413.39) G30(492.13,413.39) G31(531.5,413.39) G32(570.87,413.39) G33(610.24,413.39) G34(649.61,413.39) H1(-649.61,374.02) H2(-610.24,374.02) H3(-570.87,374.02) H4(-531.5,374.02) H5(-492.13,374.02) H6(-452.76,374.02) H7(-413.39,374.02) H8(-374.02,374.02) H9(-334.65,374.02) H10(-295.28,374.02) H11(-255.91,374.02) H12(-216.54,374.02) H13(-177.17,374.02) H14(-137.8,374.02) H15(-98.43,374.02) H16(-59.06,374.02) H17(-19.69,374.02) H18(19.69,374.02) H19(59.06,374.02) H20(98.43,374.02) H21(137.8,374.02) H22(177.17,374.02) H23(216.54,374.02) H24(255.91,374.02) H25(295.28,374.02) H26(334.65,374.02) H27(374.02,374.02) H28(413.39,374.02) H29(452.76,374.02) H30(492.13,374.02) H31(531.5,374.02) H32(570.87,374.02) H33(610.24,374.02) H34(649.61,374.02) J1(-649.61,334.65) J2(-610.24,334.65) J3(-570.87,334.65) J4(-531.5,334.65) J5(-492.13,334.65) J6(-452.76,334.65) J7(-413.39,334.65) J8(-374.02,334.65) J9(-334.65,334.65) J10(-295.28,334.65) J11(-255.91,334.65) J12(-216.54,334.65) J13(-177.17,334.65) J14(-137.8,334.65) J15(-98.43,334.65) J16(-59.06,334.65) J17(-19.69,334.65) J18(19.69,334.65) J19(59.06,334.65) J20(98.43,334.65) J21(137.8,334.65) J22(177.17,334.65) J23(216.54,334.65) J24(255.91,334.65) J25(295.28,334.65) J26(334.65,334.65) J27(374.02,334.65) J28(413.39,334.65) J29(452.76,334.65) J30(492.13,334.65) J31(531.5,334.65) J32(570.87,334.65) J33(610.24,334.65) J34(649.61,334.65) K1(-649.61,295.28) K2(-610.24,295.28) K3(-570.87,295.28) K4(-531.5,295.28) K5(-492.13,295.28) K6(-452.76,295.28) K7(-413.39,295.28) K8(-374.02,295.28) K9(-334.65,295.28) K10(-295.28,295.28) K11(-255.91,295.28) K12(-216.54,295.28) K13(-177.17,295.28) K14(-137.8,295.28) K15(-98.43,295.28) K16(-59.06,295.28) K17(-19.69,295.28) K18(19.69,295.28) K19(59.06,295.28) K20(98.43,295.28) K21(137.8,295.28) K22(177.17,295.28) K23(216.54,295.28) K24(255.91,295.28) K25(295.28,295.28) K26(334.65,295.28) K27(374.02,295.28) K28(413.39,295.28) K29(452.76,295.28) K30(492.13,295.28) K31(531.5,295.28) K32(570.87,295.28) K33(610.24,295.28) K34(649.61,295.28) L1(-649.61,255.91) L2(-610.24,255.91) L3(-570.87,255.91) L4(-531.5,255.91) L5(-492.13,255.91) L6(-452.76,255.91) L7(-413.39,255.91) L8(-374.02,255.91) L9(-334.65,255.91) L10(-295.28,255.91) L11(-255.91,255.91) L12(-216.54,255.91) L13(-177.17,255.91) L14(-137.8,255.91) L15(-98.43,255.91) L16(-59.06,255.91) L17(-19.69,255.91) L18(19.69,255.91) L19(59.06,255.91) L20(98.43,255.91) L21(137.8,255.91) L22(177.17,255.91) L23(216.54,255.91) L24(255.91,255.91) L25(295.28,255.91) L26(334.65,255.91) L27(374.02,255.91) L28(413.39,255.91) L29(452.76,255.91) L30(492.13,255.91) L31(531.5,255.91) L32(570.87,255.91) L33(610.24,255.91) L34(649.61,255.91) M1(-649.61,216.54) M2(-610.24,216.54) M3(-570.87,216.54) M4(-531.5,216.54) M5(-492.13,216.54) M6(-452.76,216.54) M7(-413.39,216.54) M8(-374.02,216.54) M9(-334.65,216.54) M10(-295.28,216.54) M11(-255.91,216.54) M12(-216.54,216.54) M13(-177.17,216.54) M14(-137.8,216.54) M15(-98.43,216.54) M16(-59.06,216.54) M17(-19.69,216.54) M18(19.69,216.54) M19(59.06,216.54) M20(98.43,216.54) M21(137.8,216.54) M22(177.17,216.54) M23(216.54,216.54) M24(255.91,216.54) M25(295.28,216.54) M26(334.65,216.54) M27(374.02,216.54) M28(413.39,216.54) M29(452.76,216.54) M30(492.13,216.54) M31(531.5,216.54) M32(570.87,216.54) M33(610.24,216.54) M34(649.61,216.54) N1(-649.61,177.17) N2(-610.24,177.17) N3(-570.87,177.17) N4(-531.5,177.17) N5(-492.13,177.17) N6(-452.76,177.17) N7(-413.39,177.17) N8(-374.02,177.17) N9(-334.65,177.17) N10(-295.28,177.17) N11(-255.91,177.17) N12(-216.54,177.17) N13(-177.17,177.17) N14(-137.8,177.17) N15(-98.43,177.17) N16(-59.06,177.17) N17(-19.69,177.17) N18(19.69,177.17) N19(59.06,177.17) N20(98.43,177.17) N21(137.8,177.17) N22(177.17,177.17) N23(216.54,177.17) N24(255.91,177.17) N25(295.28,177.17) N26(334.65,177.17) N27(374.02,177.17) N28(413.39,177.17) N29(452.76,177.17) N30(492.13,177.17) N31(531.5,177.17) N32(570.87,177.17) N33(610.24,177.17) N34(649.61,177.17) P1(-649.61,137.8) P2(-610.24,137.8) P3(-570.87,137.8) P4(-531.5,137.8) P5(-492.13,137.8) P6(-452.76,137.8) P7(-413.39,137.8) P8(-374.02,137.8) P9(-334.65,137.8) P10(-295.28,137.8) P11(-255.91,137.8) P12(-216.54,137.8) P13(-177.17,137.8) P14(-137.8,137.8) P15(-98.43,137.8) P16(-59.06,137.8) P17(-19.69,137.8) P18(19.69,137.8) P19(59.06,137.8) P20(98.43,137.8) P21(137.8,137.8) P22(177.17,137.8) P23(216.54,137.8) P24(255.91,137.8) P25(295.28,137.8) P26(334.65,137.8) P27(374.02,137.8) P28(413.39,137.8) P29(452.76,137.8) P30(492.13,137.8) P31(531.5,137.8) P32(570.87,137.8) P33(610.24,137.8) P34(649.61,137.8) R1(-649.61,98.43) R2(-610.24,98.43) R3(-570.87,98.43) R4(-531.5,98.43) R5(-492.13,98.43) R6(-452.76,98.43) R7(-413.39,98.43) R8(-374.02,98.43) R9(-334.65,98.43) R10(-295.28,98.43) R11(-255.91,98.43) R12(-216.54,98.43) R13(-177.17,98.43) R14(-137.8,98.43) R15(-98.43,98.43) R16(-59.06,98.43) R17(-19.69,98.43) R18(19.69,98.43) R19(59.06,98.43) R20(98.43,98.43) R21(137.8,98.43) R22(177.17,98.43) R23(216.54,98.43) R24(255.91,98.43) R25(295.28,98.43) R26(334.65,98.43) R27(374.02,98.43) R28(413.39,98.43) R29(452.76,98.43) R30(492.13,98.43) R31(531.5,98.43) R32(570.87,98.43) R33(610.24,98.43) R34(649.61,98.43) T1(-649.61,59.06) T2(-610.24,59.06) T3(-570.87,59.06) T4(-531.5,59.06) T5(-492.13,59.06) T6(-452.76,59.06) T7(-413.39,59.06) T8(-374.02,59.06) T9(-334.65,59.06) T10(-295.28,59.06) T11(-255.91,59.06) T12(-216.54,59.06) T13(-177.17,59.06) T14(-137.8,59.06) T15(-98.43,59.06) T16(-59.06,59.06) T17(-19.69,59.06) T18(19.69,59.06) T19(59.06,59.06) T20(98.43,59.06) T21(137.8,59.06) T22(177.17,59.06) T23(216.54,59.06) T24(255.91,59.06) T25(295.28,59.06) T26(334.65,59.06) T27(374.02,59.06) T28(413.39,59.06) T29(452.76,59.06) T30(492.13,59.06) T31(531.5,59.06) T32(570.87,59.06) T33(610.24,59.06) T34(649.61,59.06) U1(-649.61,19.69) U2(-610.24,19.69) U3(-570.87,19.69) U4(-531.5,19.69) U5(-492.13,19.69) U6(-452.76,19.69) U7(-413.39,19.69) U8(-374.02,19.69) U9(-334.65,19.69) U10(-295.28,19.69) U11(-255.91,19.69) U12(-216.54,19.69) U13(-177.17,19.69) U14(-137.8,19.69) U15(-98.43,19.69) U16(-59.06,19.69) U17(-19.69,19.69) U18(19.69,19.69) U19(59.06,19.69) U20(98.43,19.69) U21(137.8,19.69) U22(177.17,19.69) U23(216.54,19.69) U24(255.91,19.69) U25(295.28,19.69) U26(334.65,19.69) U27(374.02,19.69) U28(413.39,19.69) U29(452.76,19.69) U30(492.13,19.69) U31(531.5,19.69) U32(570.87,19.69) U33(610.24,19.69) U34(649.61,19.69) V1(-649.61,-19.69) V2(-610.24,-19.69) V3(-570.87,-19.69) V4(-531.5,-19.69) V5(-492.13,-19.69) V6(-452.76,-19.69) V7(-413.39,-19.69) V8(-374.02,-19.69) V9(-334.65,-19.69) V10(-295.28,-19.69) V11(-255.91,-19.69) V12(-216.54,-19.69) V13(-177.17,-19.69) V14(-137.8,-19.69) V15(-98.43,-19.69) V16(-59.06,-19.69) V17(-19.69,-19.69) V18(19.69,-19.69) V19(59.06,-19.69) V20(98.43,-19.69) V21(137.8,-19.69) V22(177.17,-19.69) V23(216.54,-19.69) V24(255.91,-19.69) V25(295.28,-19.69) V26(334.65,-19.69) V27(374.02,-19.69) V28(413.39,-19.69) V29(452.76,-19.69) V30(492.13,-19.69) V31(531.5,-19.69) V32(570.87,-19.69) V33(610.24,-19.69) V34(649.61,-19.69) W1(-649.61,-59.06) W2(-610.24,-59.06) W3(-570.87,-59.06) W4(-531.5,-59.06) W5(-492.13,-59.06) W6(-452.76,-59.06) W7(-413.39,-59.06) W8(-374.02,-59.06) W9(-334.65,-59.06) W10(-295.28,-59.06) W11(-255.91,-59.06) W12(-216.54,-59.06) W13(-177.17,-59.06) W14(-137.8,-59.06) W15(-98.43,-59.06) W16(-59.06,-59.06) W17(-19.69,-59.06) W18(19.69,-59.06) W19(59.06,-59.06) W20(98.43,-59.06) W21(137.8,-59.06) W22(177.17,-59.06) W23(216.54,-59.06) W24(255.91,-59.06) W25(295.28,-59.06) W26(334.65,-59.06) W27(374.02,-59.06) W28(413.39,-59.06) W29(452.76,-59.06) W30(492.13,-59.06) W31(531.5,-59.06) W32(570.87,-59.06) W33(610.24,-59.06) W34(649.61,-59.06) Y1(-649.61,-98.43) Y2(-610.24,-98.43) Y3(-570.87,-98.43) Y4(-531.5,-98.43) Y5(-492.13,-98.43) Y6(-452.76,-98.43) Y7(-413.39,-98.43) Y8(-374.02,-98.43) Y9(-334.65,-98.43) Y10(-295.28,-98.43) Y11(-255.91,-98.43) Y12(-216.54,-98.43) Y13(-177.17,-98.43) Y14(-137.8,-98.43) Y15(-98.43,-98.43) Y16(-59.06,-98.43) Y17(-19.69,-98.43) Y18(19.69,-98.43) Y19(59.06,-98.43) Y20(98.43,-98.43) Y21(137.8,-98.43) Y22(177.17,-98.43) Y23(216.54,-98.43) Y24(255.91,-98.43) Y25(295.28,-98.43) Y26(334.65,-98.43) Y27(374.02,-98.43) Y28(413.39,-98.43) Y29(452.76,-98.43) Y30(492.13,-98.43) Y31(531.5,-98.43) Y32(570.87,-98.43) Y33(610.24,-98.43) Y34(649.61,-98.43)
Top Overlay:
  lines w8: -684.98,649.61 -684.98,684.98 -649.61,684.98 ; -684.98,649.61 -684.98,-684.98 684.98,-684.98 684.98,684.98 -649.61,684.98 ; -684.98,649.61 -649.61,684.98
Top Solder:
  drawing of 1152 lines, arcs and shapes, not listed